# Altium footprint library 电容封装库.PcbLib: 100 footprints (part 1 of 7)
Each footprint in its own frame and in the unit in brackets; x right, y up, seen from the top. Pads: shape width x height; smd on the part's side, far side on the other; paste and mask are expansions set on the pad; w line width, h text height; cw(c..) or ccw(c..) is an arc to the next point about the centre after c.
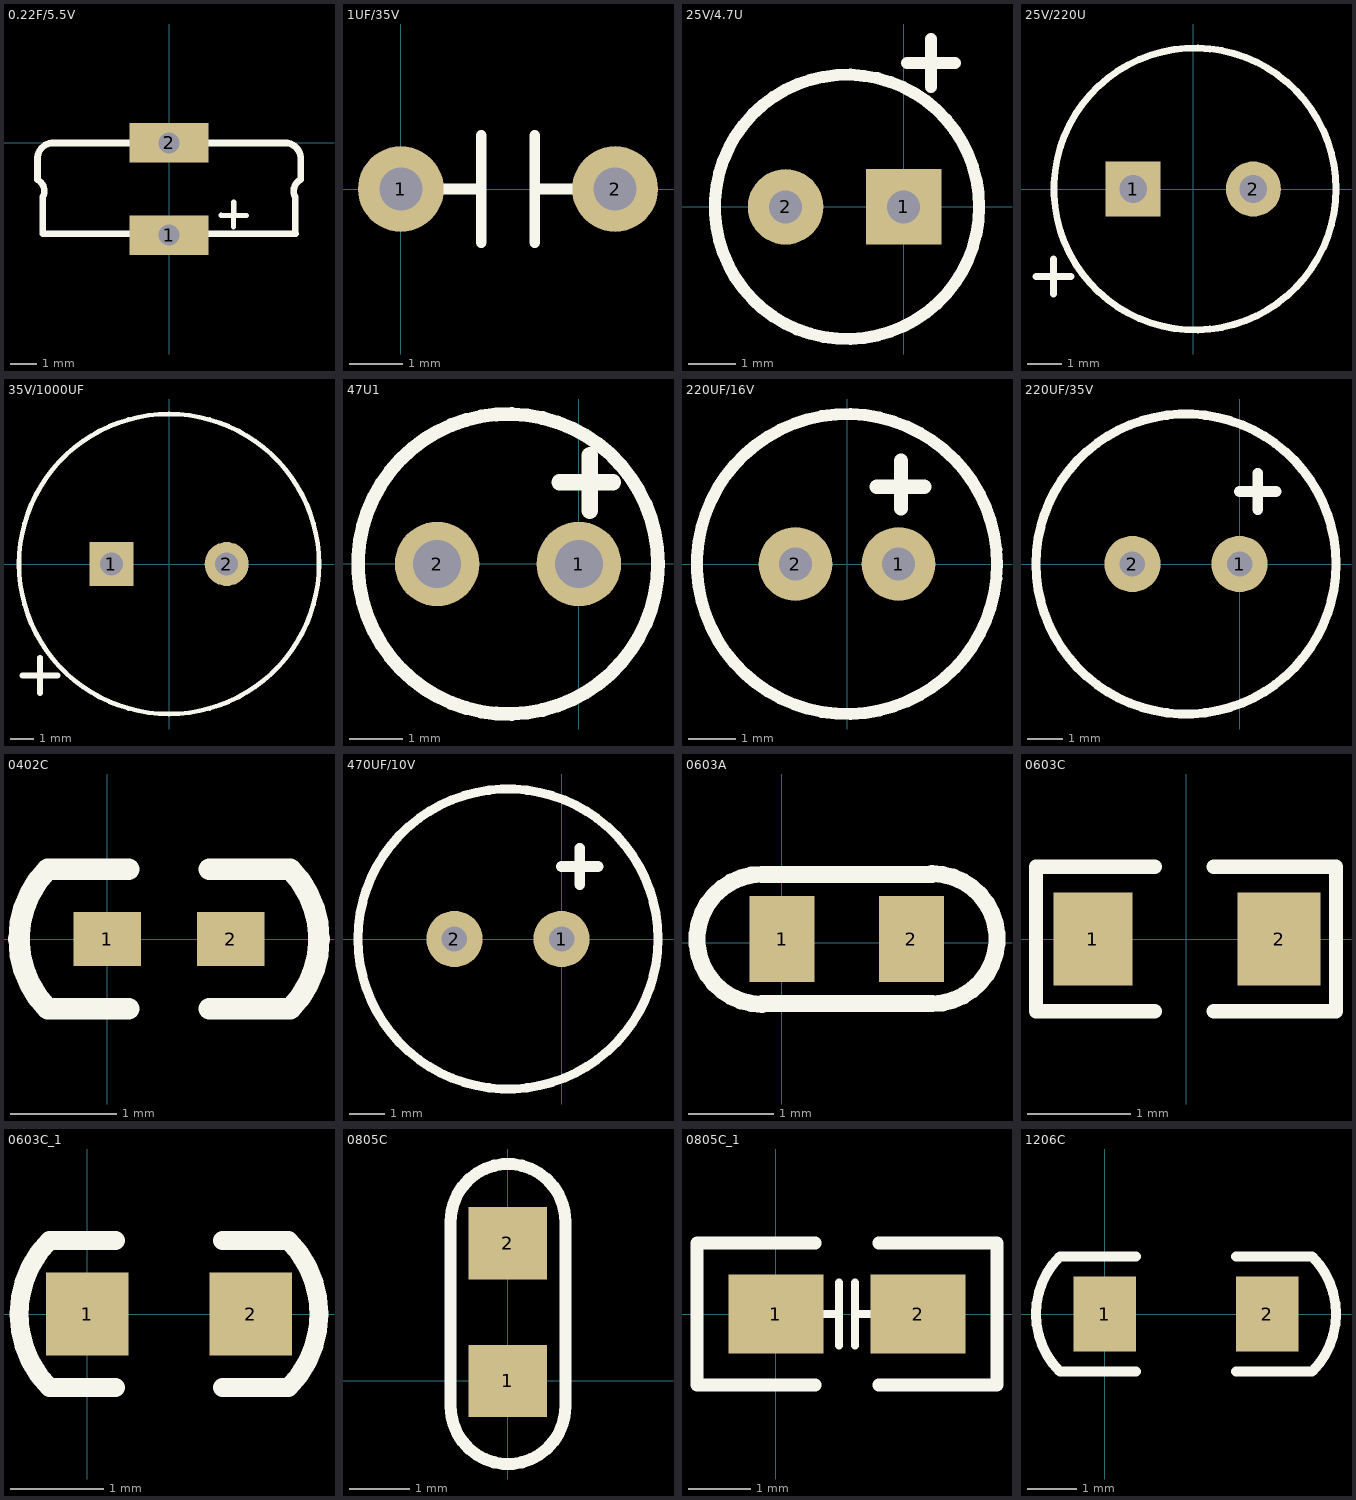
[diagram p0: the footprints below, top view; thin cyan lines are the x and y axes]

## 0.22F/5.5V [mm]
pads (2):
  rect 3x1.5 hole 0.8: 1(0,-3.5) 2(0,0)
Top Overlay:
  lines w0.2: 1.97,-2.75 2.93,-2.76 ; 2.45,-3.19 2.46,-2.25
  lines w0.254: 4.36,0 cw(c4.41,-0.59) 5,-0.54 5,-1.39 ; 4.5,0 -4.46,0 ccw(c-4.41,-0.59) -5,-0.64 -5,-1.4 cw(c-5.225,-1.825) -4.8,-2.05 -4.8,-3.45 0,-3.45 4.8,-3.45 ; 4.79,-3.45 4.79,-2.05 cw(c5.215,-1.825) 4.99,-1.4

## 1UF/35V [mm]
pads (2):
  round 1.6 hole 0.8: 1(0,0) 2(4,0)
Top Overlay:
  lines w0.2: 0,0 1.5,0 ; 1.5,-1 1.5,1 ; 2.5,-1 2.5,1 ; 2.5,0 4,0

## 25V/4.7U [mm]
pads (2):
  rect 1.6x1.6 hole 0.7: 1(0,0)
  round 1.6 hole 0.7: 2(-2.5,0)
Top Overlay:
  circle w0.254: c-1.2,0 r2.8
  lines w0.254: 0.07,3.048 1.086,3.048 ; 0.578,2.54 0.578,3.556
3D body: height 7.3, standoff -1.2, extent -3.683,-2.496 1.315,2.496

## 25V/220U [mm]
pads (2):
  rect 1.6x1.6 hole 0.8: 1(-1.75,0)
  round 1.6 hole 0.8: 2(1.75,0)
Top Overlay:
  circle w0.2: c0.052,0 r4.1
  lines w0.2: -4.572,-2.54 -3.556,-2.54 ; -4.064,-3.048 -4.064,-2.032
3D body: height 12.8, standoff -0.7, extent -3.999,-4.051 3.999,3.937

## 35V/1000UF [mm]
pads (2):
  rect 1.905x1.905 hole 1: 1(-2.5,0)
  round 1.905 hole 1: 2(2.5,0)
Top Overlay:
  circle w0.203: c0,0 r6.5
  lines w0.254: -6.35,-4.826 -4.826,-4.826 ; -5.588,-5.588 -5.588,-4.064
3D body: height 21, standoff -3, extent -6.152,-6.223 6.35,6.238

## 47U1 [mil]
pads (2):
  round 62 hole 35.43: 1(0.15,-0.25) 2(-104.1,-0.25)
Top Overlay:
  circle w10: c-51.98,-0.25 r110.24
  lines w12: -14.18,59.75 25.19,59.75 ; 8.02,38.8 8.02,79.75

## 220UF/16V [mil]
pads (2):
  round 62 hole 28: 1(43.31,0) 2(-43.31,0)
Top Overlay:
  circle w10: c0,0 r125.98
  lines w12: 24.96,64.96 64.96,64.96 ; 45.28,46.61 45.28,86.61

## 220UF/35V [mil]
pads (2):
  round 62 hole 28: 1(0,0) 2(-118.11,0)
Top Overlay:
  circle w10: c-59.06,0 r165.35
  lines w12: 0,80 40,80 ; 20,60 20,100

## 0402C [mil]
pads (2):
  rect 25x20 smd: 1(0,0) 2(46,0)
Top Overlay:
  lines w8: 8,-26 -22,-26 cw(c4,0) -22,26 8,26 ; 38,-26 68,-26 ccw(c42,0) 68,26 38,26

## 470UF/10V [mil]
pads (2):
  round 62 hole 28: 1(0,0) 2(-118.11,0)
Top Overlay:
  circle w10: c-59.06,0 r165.35
  lines w12: 0,80 40,80 ; 20,60 20,100

## 0603A [mil]
pads (2):
  rect 30x40 smd: 1(0.15,1.65) 2(60.15,1.65)
Top Overlay:
  lines w7.87: -9.1,-28.63 cw(c-9.1,1.51) -9.1,31.65 69.64,31.65 ; -9.1,-28.35 69.64,-28.35 ccw(c69.64,1.8) 69.64,31.94
3D body: height 23.62, standoff 0, extent -1.5,-15 61.5,16.5

## 0603C [mm]
pads (2):
  rect 0.762x0.9 smd: 1(-0.9,0)
  rect 0.8x0.9 smd: 2(0.9,0)
Top Overlay:
  lines w0.14: -0.3,-0.7 -1.45,-0.7 -1.45,0.7 -0.3,0.7 ; 0.266,-0.7 1.45,-0.7 1.45,0.7 0.266,0.7
3D body: height 0.6, standoff 0, extent -0.762,-0.381 0.838,0.419

## 0603C_1 [mil]
pads (2):
  rect 35x35 smd: 1(0,0) 2(69,0)
Top Overlay:
  lines w8: 12,-31 -16,-31 cw(c15,0) -16,31 12,31 ; 57,-31 85,-31 ccw(c54,0) 85,31 57,31
3D body: height 23.62, standoff 0, extent 0.5,-16 63.5,15.5

## 0805C [mm]
pads (2):
  rect 1.3x1.2 smd: 1(0.004,-0.004) 2(0.004,2.282)
Top Overlay:
  lines w0.2: -0.943,-0.432 ccw(c0.007,-0.432) 0.957,-0.432 0.957,2.643 ccw(c0.007,2.643) -0.943,2.643 -0.943,-0.432

## 0805C_1 [mil]
pads (2):
  rect 60x50 smd: 1(0,0) 2(90,0)
Top Overlay:
  lines w5: 30,0 40,0 ; 40,-20 40,20 ; 50,-20 50,20 ; 50,0 60,0
  lines w8: 25,-45 -50,-45 -50,45 25,45 ; 65,-45 140,-45 140,45 65,45

## 1206C [mil]
pads (2):
  rect 50x60 smd: 1(0,0) 2(130,0)
Top Overlay:
  lines w8: 25,-46 -36,-46 cw(c10,0) -36,46 25,46 ; 105,-46 166,-46 ccw(c120,0) 166,46 105,46